# Altium footprint library 电容.PcbLib: 172 footprints (part 7 of 11)
Each footprint in its own frame and in the unit in brackets; x right, y up, seen from the top. Pads: shape width x height; smd on the part's side, far side on the other; paste and mask are expansions set on the pad; w line width, h text height; cw(c..) or ccw(c..) is an arc to the next point about the centre after c.
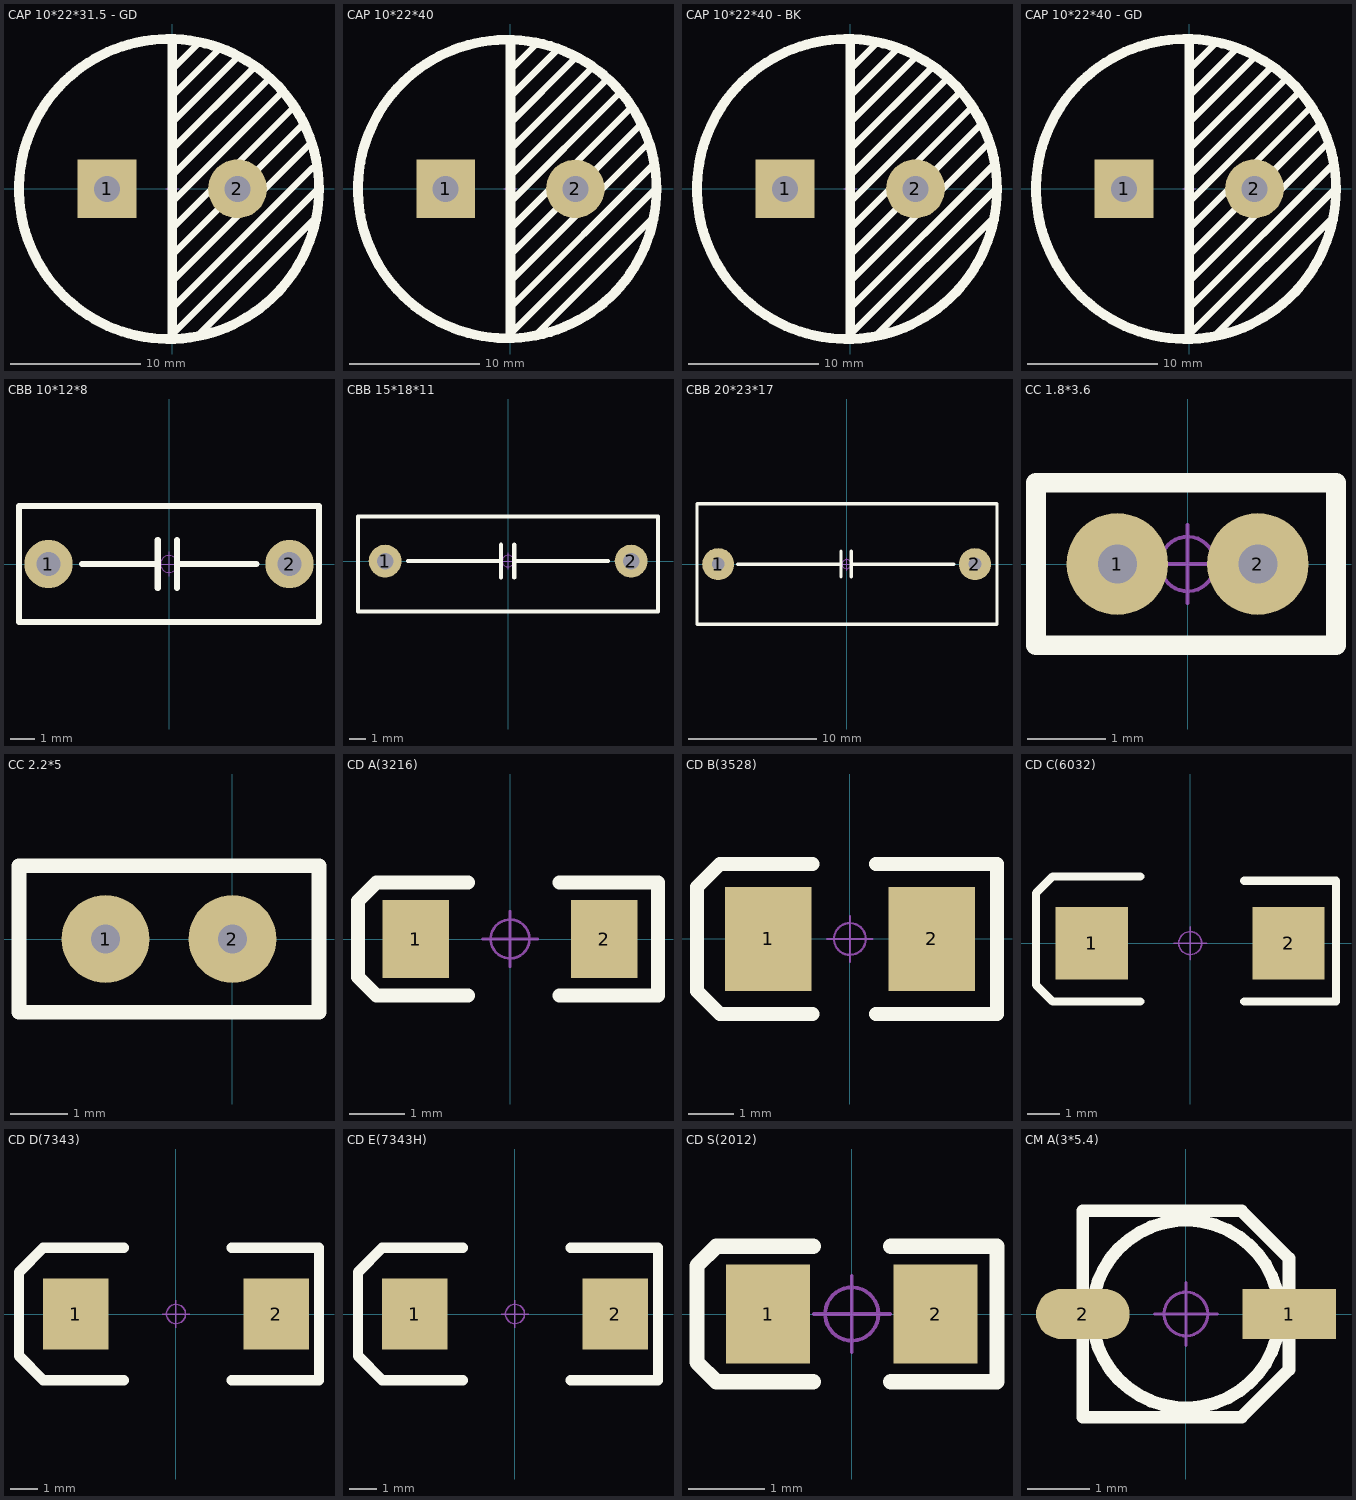
[diagram p6: the footprints below, top view; thin cyan lines are the x and y axes]

## CAP 10*22*31.5 - GD [mm] "脚距10mm直径22mm高度31.5mm"
pads (2):
  rect 4.5x4.5 hole 2: 1(-5,0)
  round 4.5 hole 2: 2(5,0)
Top Overlay:
  circle w0.754: c-0.248,-0.013 r11.5
  lines w0.504: 0,-7.112 10.541,3.429 ; 0,-5.08 10.033,4.953 ; 0,-3.048 9.271,6.223 ; 0,-1.016 8.382,7.366 ; 0,1.016 7.493,8.509 ; 0,3.048 6.223,9.271 ; 0,5.08 4.953,10.033 ; 0,7.112 3.556,10.668 ; 0.254,-10.922 11.208,0.032 ; 0.254,-8.89 10.731,1.587 ; 0.254,9.398 2.032,11.176 ; 1.778,-11.43 11.049,-2.159
  lines w0.754: 0,-11.25 0,11.25
Mechanical 15:
  circle w0.05: c0,0 r0.35
  lines w0.05: -0.5,0 0.5,0 ; 0,-0.5 0,0.5
3D body "CAP 10X22X31.5.STEP": height 31.54, standoff -3.37, extent -11,-10.997 11.01,10.997

## CAP 10*22*40 [mm] "脚距10mm直径22mm高度40mm"
pads (2):
  rect 4.5x4.5 hole 2: 1(-5,0)
  round 4.5 hole 2: 2(5,0)
Top Overlay:
  circle w0.754: c-0.248,-0.013 r11.5
  lines w0.504: 0,-7.112 10.541,3.429 ; 0,-5.08 10.033,4.953 ; 0,-3.048 9.271,6.223 ; 0,-1.016 8.382,7.366 ; 0,1.016 7.493,8.509 ; 0,3.048 6.223,9.271 ; 0,5.08 4.953,10.033 ; 0,7.112 3.556,10.668 ; 0.254,-10.922 11.367,0.191 ; 0.254,-8.89 10.986,1.841 ; 0.254,9.398 2.032,11.176 ; 1.778,-11.43 11.049,-2.159
  lines w0.754: 0,-11.25 0,11.25
Mechanical 15:
  circle w0.05: c0,0 r0.35
  lines w0.05: -0.5,0 0.5,0 ; 0,-0.5 0,0.5
3D body "CAP 10X22X40.STEP": height 40.03, standoff -3.38, extent -11,-10.999 11.01,10.999

## CAP 10*22*40 - BK [mm] "脚距10mm直径22mm高度40mm"
pads (2):
  rect 4.5x4.5 hole 2: 1(-5,0)
  round 4.5 hole 2: 2(5,0)
Top Overlay:
  circle w0.754: c-0.248,-0.013 r11.5
  lines w0.504: 0,-7.112 10.541,3.429 ; 0,-5.08 10.033,4.953 ; 0,-3.048 9.271,6.223 ; 0,-1.016 8.382,7.366 ; 0,1.016 7.493,8.509 ; 0,3.048 6.223,9.271 ; 0,5.08 4.953,10.033 ; 0,7.112 3.556,10.668 ; 0.254,-10.922 11.208,0.032 ; 0.254,-8.89 11.049,1.905 ; 0.254,9.398 2.032,11.176 ; 1.778,-11.43 11.049,-2.159
  lines w0.754: 0,-11.25 0,11.25
Mechanical 15:
  circle w0.05: c0,0 r0.35
  lines w0.05: -0.5,0 0.5,0 ; 0,-0.5 0,0.5
3D body "CAP 10X22X40.STEP": height 40.04, standoff -3.37, extent -11,-10.999 11.01,10.999

## CAP 10*22*40 - GD [mm] "脚距10mm直径22mm高度40mm"
pads (2):
  rect 4.5x4.5 hole 2: 1(-5,0)
  round 4.5 hole 2: 2(5,0)
Top Overlay:
  circle w0.754: c-0.248,-0.013 r11.5
  lines w0.504: 0,-7.112 10.541,3.429 ; 0,-5.08 10.033,4.953 ; 0,-3.048 9.271,6.223 ; 0,-1.016 8.382,7.366 ; 0,1.016 7.493,8.509 ; 0,3.048 6.223,9.271 ; 0,5.08 4.953,10.033 ; 0,7.112 3.556,10.668 ; 0.254,-10.922 11.208,0.032 ; 0.254,-8.89 11.049,1.905 ; 0.254,9.398 2.032,11.176 ; 1.778,-11.43 11.049,-2.159
  lines w0.754: 0,-11.25 0,11.25
Mechanical 15:
  circle w0.05: c0,0 r0.35
  lines w0.05: -0.5,0 0.5,0 ; 0,-0.5 0,0.5
3D body "CAP 10X22X40.STEP": height 40.04, standoff -3.37, extent -11,-10.999 11.01,10.999

## CBB 10*12*8 [mm] "脚距10mm高12mm厚8mm"
pads (2):
  round 2 hole 1: 1(-5,0) 2(5,0)
Top Overlay:
  lines w0.254: -3.603,0 -0.555,0 ; -0.466,-1 -0.466,1 ; 0.334,-1 0.334,1 ; 0.461,0 3.636,0 ; -6.223,-2.413 6.223,-2.413 6.223,2.413 -6.223,2.413 -6.223,-2.413
Mechanical 15:
  circle w0.05: c0,0 r0.35
  lines w0.05: -0.5,0 0.5,0 ; 0,-0.5 0,0.5
3D body "CBB 10X12X8.STEP": height 8.53, standoff -3.47, extent -6,-2.25 6,2.25

## CBB 15*18*11 [mm] "脚距15mm高18mm厚11mm"
pads (2):
  round 2 hole 1: 1(-7.5,0) 2(7.5,0)
Top Overlay:
  lines w0.254: -6.103,0 -0.515,0 ; -0.426,-1 -0.426,1 ; 0.374,-1 0.374,1 ; 0.501,0 6.089,0 ; -9.151,-3.073 -9.151,2.718 9.137,2.718 9.137,-3.073 -9.151,-3.073
Mechanical 15:
  circle w0.05: c0,0 r0.35
  lines w0.05: -0.5,0 0.5,0 ; 0,-0.5 0,0.5
3D body "CBB 15X18X11.STEP": height 11.53, standoff -3.47, extent -9.007,-2.921 8.993,2.579

## CBB 20*23*17 [mm] "脚距20mm高23mm厚17mm"
pads (2):
  round 2.5 hole 1: 1(-10,0) 2(10,0)
Top Overlay:
  lines w0.254: -8.476,0 -0.515,0 ; -0.426,-1 -0.426,1 ; 0.374,-1 0.374,1 ; 0.414,0 8.375,0 ; -11.651,-4.674 -11.651,4.699 11.717,4.699 11.717,-4.674 -11.651,-4.674
Mechanical 15:
  circle w0.05: c0,0 r0.35
  lines w0.05: -0.5,0 0.5,0 ; 0,-0.5 0,0.5
3D body "CBB 20X23X17.STEP": height 17.53, standoff -3.47, extent -11.5,-4.5 11.5,4.5

## CC 1.8*3.6 [mm] "脚距1.8mm直径3.6mm"
pads (2):
  round 1.3 hole 0.5: 1(-0.9,0) 2(0.9,0)
Top Overlay:
  lines w0.254: -1.941,-1.041 1.9,-1.041 1.9,1.041 -1.941,1.041 -1.941,-1.041
Mechanical 15:
  circle w0.05: c0,0 r0.35
  lines w0.05: -0.5,0 0.5,0 ; 0,-0.5 0,0.5
3D body "CC 1.8X3.6.STEP": height 3.6, standoff -3.5, extent -1.8,-0.798 1.8,0.796

## CC 2.2*5 [mil] "脚距2.2mm直径5mm"
height 250
pads (2):
  round 60 hole 19.68: 1(-86.61,0) 2(0,0)
Top Overlay:
  lines w10: -145.67,-49.98 59.06,-49.98 59.06,50.02 -145.67,50.02 -145.67,-49.98
3D body "CC 2.2X5.STEP": height 188.98, standoff -137.86, extent -137.79,-36.11 51.18,36.14

## CD A(3216) [mm] "长3.2mm，宽1.6mm，厚1.6mm"
pads (2):
  rect 1.2x1.4 smd: 1(-1.7,0) 2(1.7,0)
Top Overlay:
  lines w0.254: -0.762,-1.016 -2.413,-1.016 -2.743,-0.686 -2.743,0.686 -2.413,1.016 -0.762,1.016 ; 0.889,-1.016 2.667,-1.016 2.667,1.016 0.889,1.016
Mechanical 15:
  circle w0.05: c0,0 r0.35
  lines w0.05: -0.5,0 0.5,0 ; 0,-0.5 0,0.5
3D body "CD A(3216).STEP": height 1.6, standoff -0.01, extent -1.6,-0.8 1.6,0.8

## CD B(3528) [mil] "长3.5mm，宽2.8mm，厚1.9mm"
pads (2):
  rect 75x90 smd: 1(-70.87,-0.01) 2(70.86,-0.01)
Top Overlay:
  lines w12: -32.51,-65.01 -112.51,-65.01 -132.51,-45.01 -132.51,44.99 -112.51,64.99 -32.51,64.99 ; 22.49,-65.01 127.49,-65.01 127.49,64.99 22.49,64.99
Mechanical 15:
  circle w1.97: c0,0 r13.78
  lines w1.97: -19.68,0 19.68,0 ; 0,-19.68 0,19.68
3D body "CD B(3528).STEP": height 74.84, standoff -0.3, extent -68.92,-55.12 68.91,55.11

## CD C(6032) [mm] "长6.0mm，宽3.2mm，厚2.5mm"
pads (2):
  rect 2.2x2.2 smd: 1(-3,0) 2(3,0)
Top Overlay:
  lines w0.254: -1.524,-1.778 -4.191,-1.778 -4.699,-1.27 -4.699,1.524 -4.191,2.032 -1.524,2.032 ; 1.651,-1.778 4.445,-1.778 4.445,1.905 1.651,1.905
Mechanical 15:
  circle w0.05: c0,0 r0.35
  lines w0.05: -0.5,0 0.5,0 ; 0,-0.5 0,0.5
3D body "CD C(6032).STEP": height 2.5, standoff -0.01, extent -3,-1.6 3,1.6

## CD D(7343) [mm] "长7.3mm，宽4.3mm，厚2.8mm"
pads (2):
  rect 2.4x2.6 smd: 1(-3.65,0) 2(3.65,0)
Top Overlay:
  lines w0.381: -1.905,-2.413 -4.826,-2.413 -5.715,-1.524 -5.715,1.524 -4.826,2.413 -1.905,2.413 ; 2.032,-2.413 5.207,-2.413 5.207,2.413 2.032,2.413
Mechanical 15:
  circle w0.05: c0,0 r0.35
  lines w0.05: -0.5,0 0.5,0 ; 0,-0.5 0,0.5
3D body "CD D(7343H).STEP": height 2.8, standoff -0.01, extent -3.65,-2.15 3.65,2.15

## CD E(7343H) [mm] "长7.3mm，宽4.3mm，厚4.0mm"
pads (2):
  rect 2.4x2.6 smd: 1(-3.65,0) 2(3.65,0)
Top Overlay:
  lines w0.381: -1.905,-2.413 -4.826,-2.413 -5.715,-1.524 -5.715,1.524 -4.826,2.413 -1.905,2.413 ; 2.032,-2.413 5.207,-2.413 5.207,2.413 2.032,2.413
Mechanical 15:
  circle w0.05: c0,0 r0.35
  lines w0.05: -0.5,0 0.5,0 ; 0,-0.5 0,0.5
3D body "CD E(7343H).STEP": height 4, standoff -0.01, extent -3.65,-2.15 3.65,2.15

## CD S(2012) [mm] "长2.0mm，宽1.25mm，厚1.2mm"
pads (2):
  rect 1.1x1.3 smd: 1(-1.1,0) 2(1.1,0)
Top Overlay:
  lines w0.203: -0.508,-0.889 -1.778,-0.889 -2.032,-0.635 -2.032,0.254 -2.032,0.635 -1.778,0.889 -0.508,0.889 ; 0.508,-0.889 1.905,-0.889 1.905,0.889 0.508,0.889
Mechanical 15:
  circle w0.05: c0,0 r0.35
  lines w0.05: -0.5,0 0.5,0 ; 0,-0.5 0,0.5
3D body "CD S(2012).STEP": height 1.2, standoff 0, extent -1,-0.6 1,0.6

## CM A(3*5.4) [mm] "贴片电解电容，直径3mm，高5.4mm"
pads (2):
  rect 1.5x0.8 smd: 1(1.651,0)
  oval 1.5x0.8 smd: 2(-1.65,0)
Top Overlay:
  circle w0.203: c0,0 r1.5
  lines w0.203: -1.65,-1.65 -1.65,1.65 0.89,1.65 1.65,0.89 1.65,-0.89 0.89,-1.65 -1.65,-1.65
Mechanical 15:
  circle w0.05: c0,0 r0.35
  lines w0.05: -0.5,0 0.5,0 ; 0,-0.5 0,0.5
3D body "CM A(3X5.4).STEP": height 5.4, standoff -0.01, extent -1.9,-1.65 1.9,1.65